# Altium footprint library Supernova Connectors.PcbLib: 303 footprints (part 3 of 19)
Each footprint in its own frame and in the unit in brackets; x right, y up, seen from the top. Pads: shape width x height; smd on the part's side, far side on the other; paste and mask are expansions set on the pad; w line width, h text height; cw(c..) or ccw(c..) is an arc to the next point about the centre after c.
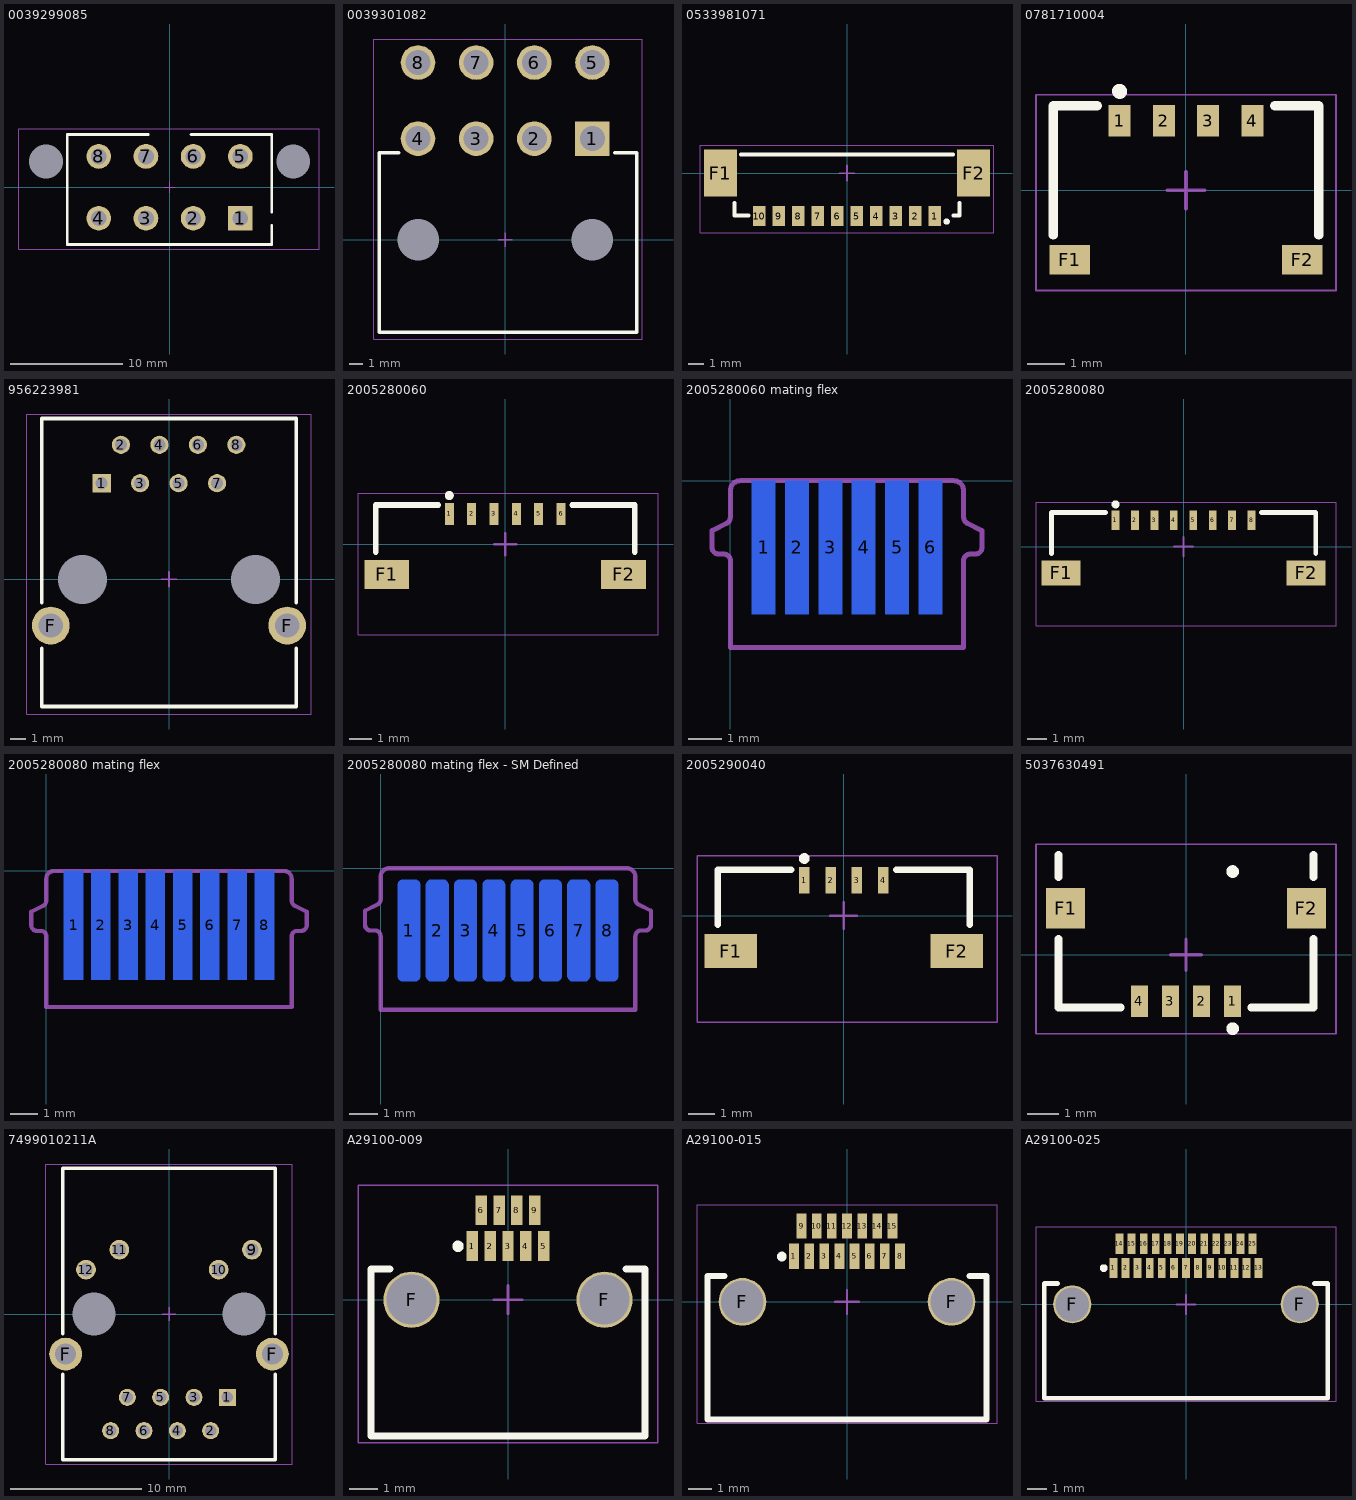
[diagram p2: the footprints below, top view; thin cyan lines are the x and y axes]

## 0039299085 [mm]
pads (10):
  rect 2.2x2.2 hole 1.4: 1(6.3,-2.75)
  round 2.2 hole 1.4: 2(2.1,-2.75) 3(-2.1,-2.75) 4(-6.3,-2.75) 5(6.3,2.75) 6(2.1,2.75) 7(-2.1,2.75) 8(-6.3,2.75)
  round 2.5 hole 3 unplated: ""(-11,2.29) ""(11,2.29)
Top Overlay:
  lines w0.254: -1.902,4.688 -9.1,4.688 -9.1,1 -9.1,-5.1 9.1,-5.1 9.1,-3.4 ; 1.902,4.688 9.1,4.688 9.1,1 9.1,-2.2
Top Courtyard:
  lines w0.05: -13.4,-5.5 13.3,-5.5 13.3,5.2 -13.4,5.2 -13.4,-5.5
  lines w0.1: -0.5,0 0.5,0 ; 0,-0.5 0,0.5
3D body "039299085.stp": height 12.8, standoff -3.5, extent -12.389,-5 12.389,6

## 0039301082 [mm]
pads (10):
  rect 2.5x2.5 hole 1.8: 1(6.3,7.3)
  round 2.5 hole 1.8: 2(2.1,7.3) 3(-2.1,7.3) 4(-6.3,7.3) 5(6.3,12.8) 6(2.1,12.8) 7(-2.1,12.8) 8(-6.3,12.8)
  round 2.5 hole 3 unplated: ""(-6.3,0) ""(6.3,0)
Top Overlay:
  lines w0.254: -7.7,6.3 -9.1,6.3 -9.1,-6.7 9.5,-6.7 9.5,6.3 7.9,6.3
Top Courtyard:
  lines w0.05: -9.5,-7.172 9.9,-7.172 9.9,14.5 -9.5,14.5 -9.5,-7.172
  lines w0.1: -0.5,0 0.5,0 ; 0,-0.5 0,0.5
3D body "039301082.stp": height 11.4, standoff -3.6, extent -9,-6.6 9.4,13.335

## 0533981071 [mm]
height 4
pads (12):
  rect 0.8x1.3 smd: 1(5.625,-2.75) 2(4.375,-2.75) 3(3.125,-2.75) 4(1.875,-2.75) 5(0.625,-2.75) 6(-0.625,-2.75) 7(-1.875,-2.75) 8(-3.125,-2.75) 9(-4.375,-2.75) 10(-5.625,-2.75)
  rect 2.1x3 smd paste-0.2: F1(-8.1,0) F2(8.1,0)
Top Overlay:
  circle w0.203: c6.378,-3.1 r0.102
  lines w0.254: -7.2,-1.9 -7.2,-2.7 -6.3,-2.7 ; -6.8,1.2 6.8,1.2 ; 6.8,-2.7 7.2,-2.7 7.2,-1.9
Top Courtyard:
  lines w0.05: -9.398,-3.81 -9.398,1.778 9.398,1.778 9.398,-3.81 -9.398,-3.81
  lines w0.1: -0.5,0 0.5,0 ; 0,-0.5 0,0.5
3D body "533981071.stp": height 4.77, standoff 0.03, extent -8.825,-3.1 8.825,1.1

## 0781710004 [mm]
pads (6):
  rect 0.6x0.85 smd: 1(-1.8,1.887) 2(-0.6,1.887) 3(0.6,1.887) 4(1.8,1.887)
  rect 1.1x0.8 smd: F1(-3.15,-1.887) F2(3.15,-1.887)
Top Overlay:
  circle w0.203: c-1.8,2.678 r0.102
  lines w0.254: -3.6,-1.212 -3.6,2.287 -2.4,2.287 ; 2.4,2.287 3.6,2.287 3.6,-1.212
Top Courtyard:
  lines w0.05: -4.064,-2.713 4.064,-2.713 4.064,2.588 -4.064,2.588 -4.064,-2.713
  lines w0.1: -0.5,0 0.5,0 ; 0,-0.5 0,0.5
3D body "781710004.stp": height 1.42, standoff -0.03, extent -3.3,-2.462 3.3,2.068

## 956223981 [mm]
pads (12):
  rect 1.2x1.2 hole 0.8: 1(-4.445,6.35)
  round 1.2 hole 0.8: 2(-3.175,8.89) 3(-1.905,6.35) 4(-0.635,8.89) 5(0.635,6.35) 6(1.905,8.89) 7(3.175,6.35) 8(4.445,8.89)
  round 2.5 hole 1.6: F(-7.805,-3.05) F(7.805,-3.05)
  round 3 hole 3.25 unplated: ""(-5.715,0) ""(5.715,0)
Top Overlay:
  lines w0.254: -8.4,-4.572 -8.4,-8.4 8.4,-8.4 8.4,-4.572 ; -8.4,-1.524 -8.4,10.617 8.4,10.617 8.4,-1.524
Top Courtyard:
  lines w0.05: -9.398,-8.89 9.398,-8.89 9.398,10.922 -9.398,10.922 -9.398,-8.89
  lines w0.1: -0.5,0 0.5,0 ; 0,-0.5 0,0.5
3D body "956223981.stp": height 13.25, standoff -3.05, extent -8.3,-8.283 8.3,10.517

## 2005280060 [mm]
pads (8):
  rect 0.4x1 smd: 1(-2.5,1.35) 2(-1.5,1.35) 3(-0.5,1.35) 4(0.5,1.35) 5(1.5,1.35) 6(2.5,1.35)
  rect 2x1.3 smd paste-0.1: F1(-5.3,-1.35) F2(5.3,-1.35)
Top Overlay:
  circle w0.203: c-2.5,2.178 r0.102
  lines w0.254: -5.8,-0.35 -5.8,1.75 -3,1.75 ; 3,1.75 5.8,1.75 5.8,-0.35
Top Courtyard:
  lines w0.05: -6.588,-4.064 6.842,-4.064 6.842,2.286 -6.588,2.286 -6.588,-4.064
  lines w0.1: -0.5,0 0.5,0 ; 0,-0.5 0,0.5
3D body "2005280060.stp": height 1.98, standoff 0.02, extent -6,-3.75 6,1.55

## 2005280060 mating flex [mm]
pads (6):
  rect 0.7x4 smd far side mask+0.102: 1(1,-2) 2(2,-2) 3(3,-2) 4(4,-2) 5(5,-2) 6(6,-2)
Bottom Solder:
  rectangle: -0.55,-3.5 7.55,0
Mechanical 1:
  lines w0.15: 0,-5 0,-2.4 ccw(c-0.2,-2.4) -0.2,-2.2 -0.35,-2.2 cw(c-0.35,-2) -0.55,-2 -0.55,-1.5 -0.112,-1.28 ccw(c-0.2,-1.1) 0,-1.1 0,-0.3 cw(c0.3,-0.3) 0.3,0 6.7,0 cw(c6.7,-0.3) 7,-0.3 7,-1.1 ccw(c7.2,-1.1) 7.112,-1.28 7.55,-1.5 7.55,-2 cw(c7.35,-2) 7.35,-2.2 7.2,-2.2 ccw(c7.2,-2.4) 7,-2.4 7,-5
Mechanical 5:
  lines w0.15: 0,-5 7,-5

## 2005280080 [mm]
pads (10):
  rect 0.4x1 smd: 1(-3.5,1.35) 2(-2.5,1.35) 3(-1.5,1.35) 4(-0.5,1.35) 5(0.5,1.35) 6(1.5,1.35) 7(2.5,1.35) 8(3.5,1.35)
  rect 2x1.3 smd paste-0.1: F1(-6.3,-1.35) F2(6.3,-1.35)
Top Overlay:
  circle w0.203: c-3.5,2.178 r0.102
  lines w0.254: -6.8,-0.35 -6.8,1.75 -4,1.75 ; 4,1.75 6.8,1.75 6.8,-0.35
Top Courtyard:
  lines w0.05: -7.588,-4.064 -7.588,2.286 7.842,2.286 7.842,-4.064 -7.588,-4.064
  lines w0.1: -0.5,0 0.5,0 ; 0,-0.5 0,0.5
3D body "2005280080.stp": height 1.98, standoff 0.02, extent -7,-3.75 7,1.55

## 2005280080 mating flex [mm]
pads (8):
  rect 0.7x4 smd far side mask+0.102: 1(1,-2) 2(2,-2) 3(3,-2) 4(4,-2) 5(5,-2) 6(6,-2) 7(7,-2) 8(8,-2)
Bottom Solder:
  rectangle: -0.6,-3.5 9.6,0
Mechanical 1:
  lines w0.15: 0,-5 0,-2.4 ccw(c-0.2,-2.4) -0.2,-2.2 -0.35,-2.2 cw(c-0.35,-2) -0.55,-2 -0.55,-1.5 -0.112,-1.28 ccw(c-0.2,-1.1) 0,-1.1 0,-0.3 cw(c0.3,-0.3) 0.3,0 8.7,0 cw(c8.7,-0.3) 9,-0.3 9,-1.1 ccw(c9.2,-1.1) 9.112,-1.28 9.55,-1.5 9.55,-2 cw(c9.35,-2) 9.35,-2.2 9.2,-2.2 ccw(c9.2,-2.4) 9,-2.4 9,-5
Mechanical 5:
  lines w0.15: 0,-5 9,-5

## 2005280080 mating flex - SM Defined [mm]
pads (8):
  rrect50% 0.8x3.6 smd far side mask-0.1: 1(1,-2.2) 2(2,-2.2) 3(3,-2.2) 4(4,-2.2) 5(5,-2.2) 6(6,-2.2) 7(7,-2.2) 8(8,-2.2)
Mechanical 1:
  lines w0.15: 0,-5 0,-2.4 ccw(c-0.2,-2.4) -0.2,-2.2 -0.35,-2.2 cw(c-0.35,-2) -0.55,-2 -0.55,-1.5 -0.112,-1.28 ccw(c-0.2,-1.1) 0,-1.1 0,-0.3 cw(c0.3,-0.3) 0.3,0 8.7,0 cw(c8.7,-0.3) 9,-0.3 9,-1.1 ccw(c9.2,-1.1) 9.112,-1.28 9.55,-1.5 9.55,-2 cw(c9.35,-2) 9.35,-2.2 9.2,-2.2 ccw(c9.2,-2.4) 9,-2.4 9,-5
Mechanical 5:
  lines w0.15: 0,-5 9,-5

## 2005290040 [mm]
pads (6):
  rect 0.4x1 smd: 1(-1.5,1.35) 2(-0.5,1.35) 3(0.5,1.35) 4(1.5,1.35)
  rect 2x1.3 smd paste-0.1: F1(-4.3,-1.35) F2(4.3,-1.35)
Top Overlay:
  circle w0.203: c-1.5,2.178 r0.102
  lines w0.254: -4.8,-0.35 -4.8,1.75 -2,1.75 ; 2,1.75 4.8,1.75 4.8,-0.35
Top Courtyard:
  lines w0.05: -5.588,-4.064 5.842,-4.064 5.842,2.286 -5.588,2.286 -5.588,-4.064
  lines w0.1: -0.5,0 0.5,0 ; 0,-0.5 0,0.5
3D body "2005290040.stp": height 1.98, standoff 0.02, extent -5,-3.75 5,1.55

## 5037630491 [mm]
pads (6):
  rect 0.55x1 smd: 1(1.5,-1.495) 2(0.5,-1.495) 3(-0.5,-1.495) 4(-1.5,-1.495)
  rect 1.26x1.3 smd: F1(-3.875,1.495) F2(3.875,1.495)
Top Overlay:
  circle w0.203: c1.5,-2.378 r0.102
  circle w0.203: c1.5,2.678 r0.102
  lines w0.254: -4.1,0.505 -4.1,-1.695 -2.1,-1.695 ; -4.1,2.505 -4.1,3.205 ; 2.1,-1.695 4.1,-1.695 4.1,0.505 ; 4.1,2.505 4.1,3.205
Top Courtyard:
  lines w0.05: -4.826,-2.54 4.826,-2.54 4.826,3.556 -4.826,3.556 -4.826,-2.54
  lines w0.1: -0.5,0 0.5,0 ; 0,-0.5 0,0.5
3D body "5037630491.stp": height 1.53, standoff 0.03, extent -4.3,-1.835 4.3,3.355

## 7499010211A [mm]
pads (16):
  rect 1.3x1.3 hole 0.9: 1(4.445,-6.35)
  round 1.3 hole 0.9: 2(3.175,-8.89) 3(1.905,-6.35) 4(0.635,-8.89) 5(-0.635,-6.35) 6(-1.905,-8.89) 7(-3.175,-6.35) 8(-4.445,-8.89)
  round 1.5 hole 1.02: 9(6.325,4.9) 10(3.785,3.38) 11(-3.785,4.9) 12(-6.325,3.38)
  round 2.5 hole 1.6: F(-7.875,-3.05) F(7.875,-3.05)
  round 3 hole 3.25 unplated: ""(-5.715,0) ""(5.715,0)
Top Overlay:
  lines w0.254: -8.1,-4.6 -8.1,-11.1 8.1,-11.1 8.1,-4.6 ; -8.1,-1.5 -8.1,11.1 8.1,11.1 8.1,-1.5
Top Courtyard:
  lines w0.05: -9.398,-11.43 -9.398,11.43 9.398,11.43 9.398,-11.43 -9.398,-11.43
  lines w0.1: -0.5,0 0.5,0 ; 0,-0.5 0,0.5
3D body "7499010211A (rev1).stp": height 13.55, standoff -3, extent -7.94,-10.95 7.94,10.89

## A29100-009 [mil]
pads (11):
  rect 16x41.5 smd mask+0: 1(-50,75.2) 2(-25,75.2) 3(0,75.2) 4(25,75.2) 5(50,75.2) 6(-37.5,125.2) 7(-12.5,125.2) 8(12.5,125.2) 9(37.5,125.2)
  round 78.74 / inner round 78.74 / far side round 118.11 hole 70.08: F(-135.04,0) F(135.04,0)
Top Overlay:
  circle w8: c-70,74.8 r4
  lines w10: -165,43 -192,43 -192,-191 192,-191 192,43 165,43
Top Courtyard:
  lines w1.97: -210,-200 210,-200 210,160 -210,160 -210,-200
  lines w3.94: -19.68,0 19.68,0 ; 0,-19.69 0,19.68
3D body "A29100-009.STEP": height 140, standoff -0.8, extent -187.49,-186.5 187.51,137.51

## A29100-015 [mil]
pads (17):
  rect 16x41.5 smd mask+0: 1(-87.5,75.2) 2(-62.5,75.2) 3(-37.5,75.2) 4(-12.5,75.2) 5(12.5,75.2) 6(37.5,75.2) 7(62.5,75.2) 8(87.5,75.2) 9(-75,125.2) 10(-50,125.2) 11(-25,125.2) 12(0,125.2) 13(25,125.2) 14(50,125.2) 15(75,125.2)
  round 78.74 / inner round 78.74 / far side round 118.11 hole 70.08: F(-172.54,0) F(172.54,0)
Top Overlay:
  circle w8: c-107.5,74.8 r4
  lines w10: -202.5,43 -230.5,43 -230.5,-194 230.5,-194 230.5,43 202.5,43
Top Courtyard:
  lines w1.97: -247.5,-200 247.5,-200 247.5,160 -247.5,160 -247.5,-200
  lines w3.94: -19.68,0 19.68,0 ; 0,-19.69 0,19.68
3D body "A29100-015.STEP": height 140.83, standoff -0.02, extent -224.99,-187 225,137.01

## A29100-025 [mil]
pads (27):
  rect 16x41.5 smd mask+0: 1(-150,75.2) 2(-125,75.2) 3(-100,75.2) 4(-75,75.2) 5(-50,75.2) 6(-25,75.2) 7(0,75.2) 8(25,75.2) 9(50,75.2) 10(75,75.2) 11(100,75.2) 12(125,75.2) 13(150,75.2) 14(-137.5,125.2) 15(-112.5,125.2) 16(-87.5,125.2) 17(-62.5,125.2) 18(-37.5,125.2) 19(-12.5,125.2) 20(12.5,125.2) 21(37.5,125.2) 22(62.5,125.2) 23(87.5,125.2) 24(112.5,125.2) 25(137.5,125.2)
  round 78.74 / inner round 78.74 / far side round 118.11 hole 70.08: F(-235.04,0) F(235.04,0)
Top Overlay:
  circle w8: c-170,74.8 r4
  lines w10: -265,43 -293,43 -293,-194 293,-194 293,43 265,43
Top Courtyard:
  lines w1.97: -310,-200 -310,160 310,160 310,-200 -310,-200
  lines w3.94: -19.68,0 19.68,0 ; 0,-19.68 0,19.69
3D body "A29100-025.STEP": height 140.83, standoff 0.03, extent -287.49,-188 287.51,136.01